# Altium footprint library North POLE.PcbLib: 419 footprints (part 6 of 27)
Each footprint in its own frame and in the unit in brackets; x right, y up, seen from the top. Pads: shape width x height; smd on the part's side, far side on the other; paste and mask are expansions set on the pad; w line width, h text height; cw(c..) or ccw(c..) is an arc to the next point about the centre after c.
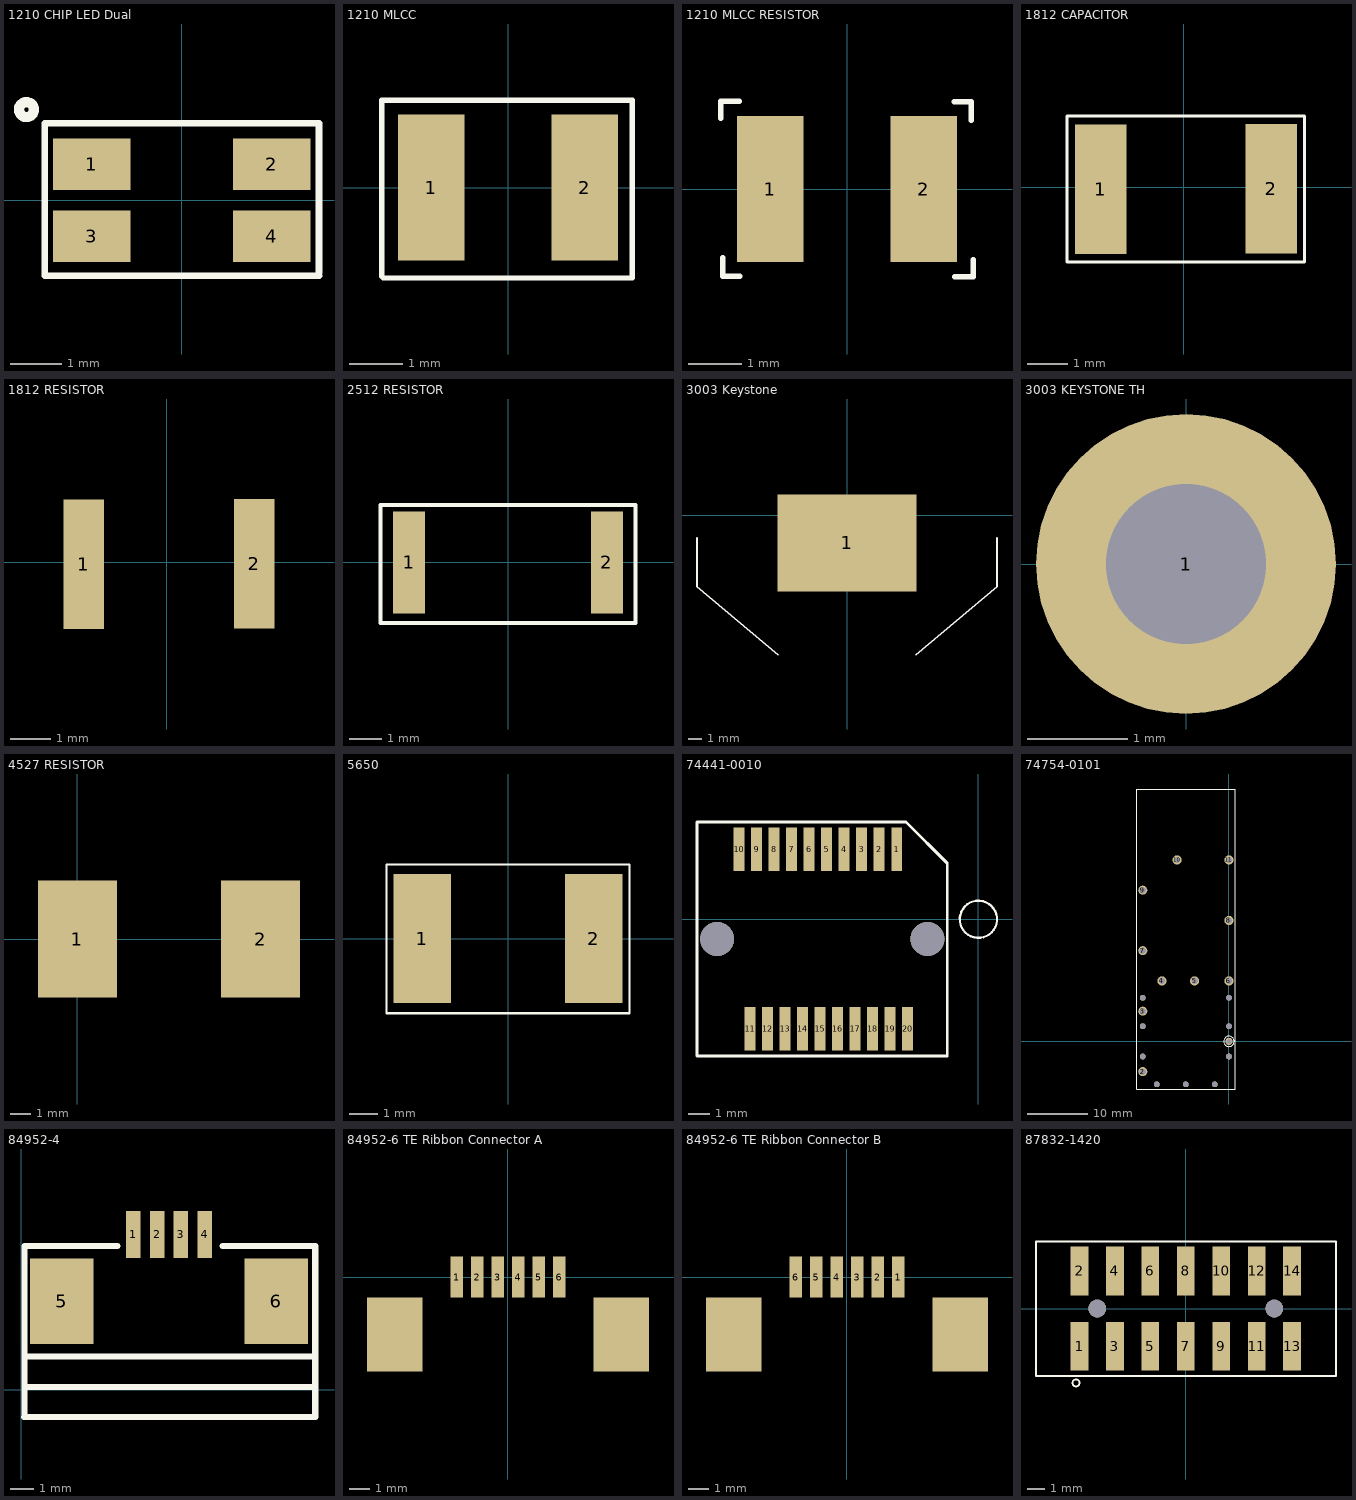
[diagram p5: the footprints below, top view; thin cyan lines are the x and y axes]

## 1210 CHIP LED Dual [mm]
pads (4):
  rect 1.5x1 smd mask+0.08: 1(-1.75,0.7) 2(1.75,0.7) 3(-1.75,-0.7) 4(1.75,-0.7)
Top Overlay:
  lines w0.127: 2.667,-1.473 -2.667,-1.473 -2.667,1.499 2.667,1.499 2.667,-1.397
  lines w0.2: -2.997,1.905 ccw(c-3.018,1.761) -2.944,1.886
3D body: height 1.09, standoff 0, extent -1.587,-1.346 1.588,1.346

## 1210 MLCC [mm]
pads (2):
  rect 1.25x2.75 smd mask+0.08: 1(-1.448,0) 2(1.448,0)
Top Overlay:
  lines w0.102: -2.372,1.642 2.338,1.642 2.338,-1.7 -2.345,-1.7 -2.372,-1.672 -2.372,1.648
3D body: height 0.95, standoff -0.01, extent -2.1,-1.35 2.1,1.35

## 1210 MLCC RESISTOR [mm]
pads (2):
  rect 1.25x2.75 smd mask+0.08: 1(-1.448,0) 2(1.448,0)
Top Overlay:
  lines w0.102: -2.372,1.328 -2.372,1.648 -2.022,1.648 ; -2.338,-1.292 -2.338,-1.642 -2.018,-1.642 ; 2.018,1.642 2.338,1.642 2.338,1.292 ; 2.022,-1.648 2.372,-1.648 2.372,-1.328
3D body: height 0.63, standoff 0, extent -2.037,-1.347 2.163,1.353

## 1812 CAPACITOR [mm]
pads (2):
  rect 1.27x3.2 smd mask+0.08: 1(-2.047,-0.048) 2(2.162,-0.038)
Top Overlay:
  lines w0.076: -2.883,-1.846 -2.883,1.753 2.988,1.753 2.988,-1.846 -2.883,-1.846
3D body: height 2.6, standoff 0, extent -2.301,-1.601 2.299,1.599

## 1812 RESISTOR [mm]
pads (2):
  rect 1x3.2 smd mask+0.08: 1(-2.047,-0.048) 2(2.162,-0.038)
3D body: height 1.6, standoff 0, extent -2.253,-1.613 2.247,1.587

## 2512 RESISTOR [mm]
pads (2):
  rect 1x3.2 smd mask+0.08: 1(-3.1,0) 2(3.1,0)
Top Overlay:
  lines w0.127: -4,-1.9 4,-1.9 4,1.8 -4,1.8 -4,-1.9
3D body: height 0.62, standoff 0, extent -3.162,-1.613 3.157,1.587

## 3003 Keystone [mm]
pads (1):
  rect 10x6.985 smd mask+0.08: 1(0,-1.975)
Top Overlay:
  lines w0.127: -10.795,-1.626 -10.795,-5.131 -4.961,-10.026 ; 4.961,-10.026 10.795,-5.131 10.795,-1.626
3D body: height 3.95, standoff -2.7, extent -11.263,-10.516 11.43,9.347
3D body: height 3.2, standoff 0, extent -10,-10 10,10

## 3003 KEYSTONE TH [mm]
pads (1):
  round 3 hole 1.6 mask+0.08: 1(0,0)

## 4527 RESISTOR [mm]
pads (2):
  rect 3.94x5.84 smd: 1(0,0) 2(9.15,0)

## 5650 [mm]
pads (2):
  rect 2x4.5 smd mask+0.08: 1(-3,0) 2(3,0)
Top Overlay:
  lines w0.076: -4.25,-2.624 -4.25,2.591 4.25,2.591 4.25,-2.616 -4.242,-2.616 -4.25,-2.624
3D body: height 1.8, standoff 0, extent -2.85,-2.5 2.85,2.5

## 74441-0010 [mm]
pads (22):
  rect 0.5x2 smd paste-0.102 mask+0.1: 1(-3.73,3.2) 2(-4.53,3.2) 3(-5.33,3.2) 4(-6.13,3.2) 5(-6.93,3.2) 6(-7.73,3.2) 7(-8.53,3.2) 8(-9.33,3.2) 9(-10.13,3.2) 10(-10.93,3.2) 11(-10.43,-5) 12(-9.63,-5) 13(-8.83,-5) 14(-8.03,-5) 15(-7.23,-5) 16(-6.43,-5) 17(-5.63,-5) 18(-4.83,-5) 19(-4.03,-5) 20(-3.23,-5)
  round 1.55 hole 1.55 unplated mask+0.05: ""(-11.93,-0.9) ""(-2.33,-0.9)
Top Overlay:
  lines w0.1: 0.194,0.828 ccw(c0,0) 0.219,0.821
  lines w0.127: -12.852,-6.248 -1.422,-6.248 -1.422,2.56 -3.307,4.445 -12.852,4.445 -12.852,-6.248
3D body: height 5.42, standoff -0.85, extent -12.663,-5.462 -1.663,3.688

## 74754-0101 [mm]
pads (20):
  round 1.2 hole 0.85 mask+0.08: 1(0,0)
  round 1.5 hole 1.05 mask+0.08: 2(-14.25,-5) 3(-14.25,5) 4(-11.08,10) 5(-5.68,10) 6(0,10) 7(-14.25,15) 8(0,20) 9(-14.25,25) 10(-8.58,30) 11(0,30)
  round 0.95 hole 0.95 unplated mask+0.08: ""(-14.25,-2.5) ""(-14.25,2.5) ""(-14.25,7.2) ""(-11.93,-7.1) ""(-7.13,-7.1) ""(-2.33,-7.1) ""(0,-2.5) ""(0,2.5) ""(0,7.2)
Top Overlay:
  lines w0.1: 0.194,0.828 ccw(c0,0) 0.219,0.821
  lines w0.127: -15.215,-7.874 1.016,-7.874 1.016,41.732 -15.215,41.732 -15.215,-7.874
3D body: height 10.42, standoff -2.9, extent -15.044,-7.688 0.838,41.542

## 84952-4 [mil]
pads (6):
  rect 24x78 smd paste-4 mask+5: 1(184,256) 2(223.4,256) 3(262.8,256) 4(302.2,256)
  rect 105x141 smd paste-4 mask+5: 5(66.5,146) 6(419.7,146)
Top Overlay:
  lines w10: 4,-45 483,-45 ; 5,-45 5,5 ; 6,55 481,55 ; 158,237 5,237 5,217.2 5,5 ; 331,237 484,237 484,217.2 484,5 ; 480,5 5,5 ; 484,-45 484,5 ; 5,5 484,5
3D body: height 100.2, standoff -0.59, extent 10.36,7.46 479.65,264.94

## 84952-6 TE Ribbon Connector A [mm]
pads (8):
  rect 0.61x2 smd mask+0.08: 1(-2.5,0) 2(-1.5,0) 3(-0.5,0) 4(0.5,0) 5(1.5,0) 6(2.5,0)
  rect 2.7x3.6 smd mask+0.08: ""(-5.5,-2.8) ""(5.5,-2.8)
3D body: height 2.54, standoff -0.02, extent -6.965,-6.516 6.965,0.024

## 84952-6 TE Ribbon Connector B [mm]
pads (8):
  rect 0.61x2 smd mask+0.08: 1(2.5,0) 2(1.5,0) 3(0.5,0) 4(-0.5,0) 5(-1.5,0) 6(-2.5,0)
  rect 2.7x3.6 smd mask+0.08: ""(-5.5,-2.8) ""(5.5,-2.8)
3D body: height 2.54, standoff -0.02, extent -6.965,-6.516 6.965,0.024

## 87832-1420 [mm]
pads (16):
  rect 1x2.75 smd: 1(-6,-2.125) 2(-6,2.125) 3(-4,-2.125) 4(-4,2.125) 5(-2,-2.125) 6(-2,2.125) 7(0,-2.125) 8(0,2.125) 9(2,-2.125) 10(2,2.125) 11(4,-2.125) 12(4,2.125) 13(6,-2.125) 14(6,2.125)
  round 1 hole 1 mask+0.05: ""(-5,0) ""(5,0)
Top Overlay:
  lines w0.1: -6.034,-4.09 ccw(c-6.2,-4.202) -6.02,-4.115
  lines w0.127: -8.458,-3.81 -8.458,3.785 8.484,3.785 8.484,-3.81 -8.458,-3.81
3D body: height 7.55, standoff -1.05, extent -8.325,-3.15 8.325,3.15